# Altium footprint library EXPLORER.PcbLib: 252 footprints (part 15 of 16)
Each footprint in its own frame and in the unit in brackets; x right, y up, seen from the top. Pads: shape width x height; smd on the part's side, far side on the other; paste and mask are expansions set on the pad; w line width, h text height; cw(c..) or ccw(c..) is an arc to the next point about the centre after c.
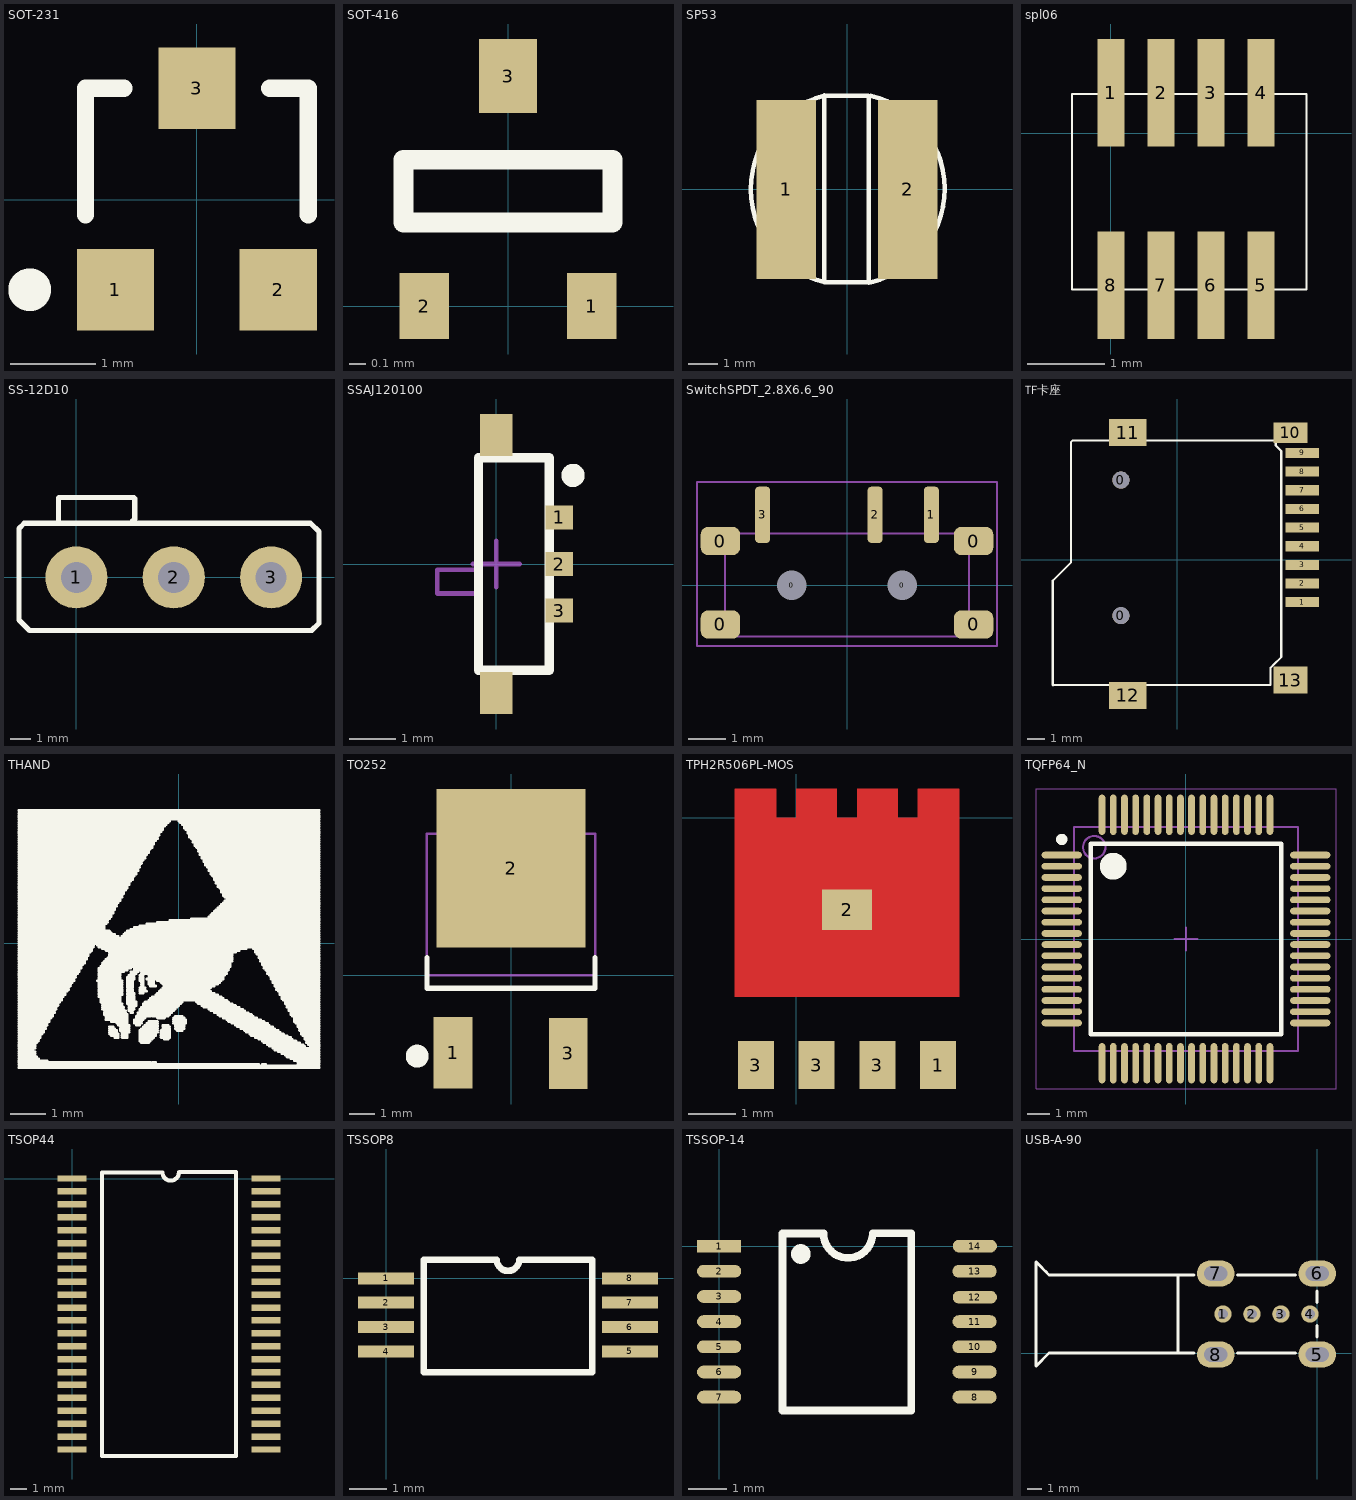
[diagram p14: the footprints below, top view; thin cyan lines are the x and y axes]

## SOT-231 [mm]
pads (3):
  rect 0.9x0.95 smd: 1(-0.95,-1.048) 2(0.95,-1.048) 3(0,1.302)
Top Overlay:
  circle w0.25: c-1.95,-1.048 r0.125
  lines w0.2: -1.3,-0.173 -1.3,1.302 -0.85,1.302 ; 0.85,1.302 1.3,1.302 1.3,-0.173

## SOT-416 [mm]
height 0.7
pads (3):
  rect 0.3x0.4 smd: 1(0.508,0) 2(-0.508,0)
  rect 0.35x0.45 smd: 3(0,1.397)
Top Overlay:
  lines w0.12: -0.635,0.508 -0.635,0.889 0.635,0.889 0.635,0.508 -0.635,0.508

## SP53 [mm]
pads (2):
  rect 2x6 smd: 1(-2.037,0) 2(2.027,0)
Top Overlay:
  lines w0.152: -0.768,-3.111 -0.768,3.149 ; 0.706,3.138 -0.765,3.138 ccw(c-0.018,0.013) -0.744,-3.117 0.712,-3.117 ; 0.732,-3.137 0.732,3.111 ; 0.784,3.143 cw(c0.058,0.013) 0.805,-3.112

## spl06 [mm]
pads (8):
  rect 0.35x1.4 smd: 1(0,0.525) 2(0.65,0.525) 3(1.3,0.525) 4(1.95,0.525) 5(1.95,-1.975) 6(1.3,-1.975) 7(0.65,-1.975) 8(0,-1.975)
Top Overlay:
  lines w0.025: -0.508,-2.032 2.54,-2.032 2.54,0.508 -0.508,0.508 -0.508,-2.032

## SS-12D10 [mm]
height 8.5
pads (3):
  round 3 hole 1.5: 1(0,0) 2(4.7,0) 3(9.4,0)
Top Overlay:
  lines w0.254: -0.864,2.692 -0.864,3.835 -0.838,3.861 2.769,3.861 2.819,3.81 2.819,2.819 2.692,2.692 ; -2.769,-2.057 -2.261,-2.565 11.354,-2.565 11.709,-2.21 11.709,2.21 11.303,2.616 -2.515,2.616 -2.769,2.362 -2.769,-2.057

## SSAJ120100 [mm]
pads (5):
  rect 0.6x0.51 smd: 1(1.355,1) 2(1.355,0) 3(1.355,-1)
  rect 0.7x0.9 smd: ""(0,-2.775) ""(0,2.775)
Top Overlay:
  circle w0.25: c1.651,1.905 r0.125
  lines w0.2: -0.381,-2.286 -0.381,2.286 1.143,2.286 1.143,-2.159 1.143,-2.286 -0.381,-2.286
Mechanical 13:
  lines w0.1: -0.381,-0.635 -1.27,-0.635 -1.27,-0.127 -0.381,-0.127 ; -0.381,-2.286 1.143,-2.286 1.143,2.286 -0.381,2.286 -0.381,-2.286
Mechanical 15:
  lines w0.1: -0.5,0 0.5,0 ; 0,-0.5 0,0.5
3D body: height 0.6, standoff 0.1, extent -0.381,-2.286 1.143,2.286
3D body: height 0.6, standoff 0.1, extent -1.27,-0.635 -0.381,-0.127

## SwitchSPDT_2.8X6.6_90 [mil]
pads (9):
  rrect50% 42x30 smd: 0(-135,-42) 0(-135,47) 0(135,-42) 0(135,47)
  round 10 hole 31.5: 0(-59.06,0) 0(59.06,0)
  rrect50% 16x60 smd: 1(90,75) 2(30,75) 3(-90,75)
Mechanical 13:
  lines w2: -130,-55 -130,55 130,55 130,-55 -130,-55
Mechanical 14:
  lines w2: -160,-65 -160,110 160,110 160,-65 -160,-65
3D body: height 55.12, standoff -19.68, extent -152.23,-110.66 150.92,86.19

## TF卡座 [mm]
pads (15):
  round 1 hole 1 unplated: 0(-3.334,-3.305) 0(-3.334,4.696)
  rect 2x0.6 smd: 1(7.366,-2.505) 2(7.366,-1.405) 3(7.366,-0.305) 4(7.366,0.795) 5(7.366,1.895) 6(7.366,2.995) 7(7.366,4.095) 8(7.366,5.195) 9(7.366,6.295)
  rect 2x1.2 smd: 10(6.666,7.495)
  rect 2.2x1.6 smd: 11(-2.934,7.495) 12(-2.934,-8.005)
  rect 2x1.6 smd: 13(6.666,-7.105)
Top Overlay:
  lines w0.127: -7.354,-7.385 -7.354,-1.242 -6.287,-0.176 -6.287,6.936 -6.185,7.038 5.804,7.038 5.804,6.733 5.905,6.632 6.125,6.412 6.125,-5.747 5.702,-6.17 5.499,-6.373 5.499,-7.389 -7.334,-7.405
3D body: height 3.2, standoff 0.5, extent -9.384,-8.305 7.816,7.795

## THAND [mm]
Top Overlay:
  drawing of 472 lines, arcs and shapes, not listed

## TO252 [mil] "252晶体管"
pads (3):
  rect 60x110 smd: 1(-89.55,-119.77) 3(88.45,-120.77)
  rect 230x245 smd: 2(0,165.35)
Top Overlay:
  circle w19.68: c-145,-125 r7.87
  lines w7.87: -130,27.56 -130,-20 130,-20 130,27.56
Mechanical 15:
  lines w3.94: -105.04,218.5 -105.04,236.06 -65.59,271.65 65.59,271.65 105.04,236.06 105.04,218.5 ; -130,0 130,0 130,218.5 -130,218.5 -130,0
3D body: height 90.55, standoff -0.2, extent -127.95,-120 127.95,250.84

## TPH2R506PL-MOS [mm]
pads (5):
  rect 0.75x1 smd: 1(2.965,-5.175) 3(-0.845,-5.175) 3(0.425,-5.175) 3(1.695,-5.175)
  rect 1.05x0.85 smd: 2(1.06,-1.925)
Top Layer:
  region: -0.42,0 -0.42,0.6 -1.29,0.6 -1.29,-3.75 3.41,-3.75 3.41,0.6 2.54,0.6 2.54,0 2.12,0 2.12,0.6 1.27,0.6 1.27,0 0.85,0 0.85,0.6 0,0.6 0,0

## TQFP64_N [mm] "Thin QFP, 64-Leads, Body 10x10mm, Pitch 0.5mm, IPC Medium Density"
height 1.6
pads (64):
  oval 1.8x0.3 smd: 1(-5.55,3.75) 2(-5.55,3.25) 3(-5.55,2.75) 4(-5.55,2.25) 5(-5.55,1.75) 6(-5.55,1.25) 7(-5.55,0.75) 8(-5.55,0.25) 9(-5.55,-0.25) 10(-5.55,-0.75) 11(-5.55,-1.25) 12(-5.55,-1.75) 13(-5.55,-2.25) 14(-5.55,-2.75) 15(-5.55,-3.25) 16(-5.55,-3.75) 33(5.55,-3.75) 34(5.55,-3.25) 35(5.55,-2.75) 36(5.55,-2.25) 37(5.55,-1.75) 38(5.55,-1.25) 39(5.55,-0.75) 40(5.55,-0.25) 41(5.55,0.25) 42(5.55,0.75) 43(5.55,1.25) 44(5.55,1.75) 45(5.55,2.25) 46(5.55,2.75) 47(5.55,3.25) 48(5.55,3.75)
  oval 0.3x1.8 smd: 17(-3.75,-5.55) 18(-3.25,-5.55) 19(-2.75,-5.55) 20(-2.25,-5.55) 21(-1.75,-5.55) 22(-1.25,-5.55) 23(-0.75,-5.55) 24(-0.25,-5.55) 25(0.25,-5.55) 26(0.75,-5.55) 27(1.25,-5.55) 28(1.75,-5.55) 29(2.25,-5.55) 30(2.75,-5.55) 31(3.25,-5.55) 32(3.75,-5.55) 49(3.75,5.55) 50(3.25,5.55) 51(2.75,5.55) 52(2.25,5.55) 53(1.75,5.55) 54(1.25,5.55) 55(0.75,5.55) 56(0.25,5.55) 57(-0.25,5.55) 58(-0.75,5.55) 59(-1.25,5.55) 60(-1.75,5.55) 61(-2.25,5.55) 62(-2.75,5.55) 63(-3.25,5.55) 64(-3.75,5.55)
Top Overlay:
  circle w0.6: c-3.25,3.25 r0.3
  circle w0.25: c-5.55,4.45 r0.125
  lines w0.2: -4.25,-4.25 4.25,-4.25 4.25,4.25 -4.25,4.25 -4.25,-4.25
Mechanical 13:
  circle w0.1: c-4.1,4.1 r0.5
  lines w0.1: -5,-5 5,-5 5,5 -5,5 -5,-5
Mechanical 15:
  lines w0.05: -6.7,-6.7 6.7,-6.7 6.7,6.7 -6.7,6.7 -6.7,-6.7
  lines w0.1: -0.5,0 0.5,0 ; 0,-0.5 0,0.5
3D body: height 1.6, standoff 0, extent -5,-5 5,5

## TSOP44 [mm]
pads (44):
  rect 1.8x0.4 smd: 1(-0.009,0.001) 2(-0.009,-0.799) 3(-0.009,-1.599) 4(-0.009,-2.399) 5(-0.009,-3.199) 6(-0.009,-3.999) 7(-0.009,-4.799) 8(-0.009,-5.599) 9(-0.009,-6.399) 10(-0.009,-7.199) 11(-0.009,-7.999) 12(-0.009,-8.799) 13(-0.009,-9.599) 14(-0.009,-10.399) 15(-0.009,-11.199) 16(-0.009,-11.999) 17(-0.009,-12.799) 18(-0.009,-13.599) 19(-0.009,-14.399) 20(-0.009,-15.199) 21(-0.009,-15.999) 22(-0.009,-16.799) 23(11.991,-16.799) 24(11.991,-15.999) 25(11.991,-15.199) 26(11.991,-14.399) 27(11.991,-13.599) 28(11.991,-12.799) 29(11.991,-11.999) 30(11.991,-11.199) 31(11.991,-10.399) 32(11.991,-9.599) 33(11.991,-8.799) 34(11.991,-7.999) 35(11.991,-7.199) 36(11.991,-6.399) 37(11.991,-5.599) 38(11.991,-4.799) 39(11.991,-3.999) 40(11.991,-3.199) 41(11.991,-2.399) 42(11.991,-1.599) 43(11.991,-0.799) 44(11.991,0.001)
Top Overlay:
  lines w0.2: 1.826,-17.199 10.156,-17.199
  lines w0.254: 6.604,0.381 cw(c6.096,0.381) 5.588,0.381 1.846,0.381 1.846,-17.18 1.826,-17.199 10.156,-17.199 ; 6.624,0.401 10.156,0.401 10.156,-17.199 ; 10.156,-17.199 10.156,-17.199

## TSSOP8 [mm]
height 1.75
pads (8):
  rect 1.5x0.32 smd: 1(0,0) 2(0,-0.65) 3(0,-1.3) 4(0,-1.95) 5(6.5,-1.95) 6(6.5,-1.3) 7(6.5,-0.65) 8(6.5,0)
Top Overlay:
  lines w0.178: 1,0.5 1,-2.5 5.5,-2.5 5.5,0.5 3.55,0.5 cw(c3.25,0.5) 2.95,0.5 1.05,0.5

## TSSOP-14 [mm] "4.96x4.40x1.00 e=0.65（蒜米工坊）"
pads (14):
  rect 1.143x0.33 smd: 1(0,0)
  oval 1.143x0.33 smd: 2(0,-0.65) 3(0,-1.3) 4(0,-1.95) 5(0,-2.6) 6(0,-3.25) 7(0,-3.9) 8(6.6,-3.9) 9(6.6,-3.25) 10(6.6,-2.6) 11(6.6,-1.95) 12(6.608,-1.321) 13(6.6,-0.65) 14(6.608,0)
Top Overlay:
  circle w0.254: c2.112,-0.203 r0.127
  lines w0.2: 2.687,0.325 1.635,0.325 1.635,-4.249 4.965,-4.249 4.965,0.325 ; 2.696,0.33 ccw(c3.331,0.33) 3.966,0.33 4.96,0.33
3D body: height 1.03, standoff -0.02, extent 0.028,-4.43 6.432,0.57

## USB-A-90 [mm]
pads (8):
  round 1.2 hole 0.7: 1(-6.5,2.7) 2(-4.5,2.7) 3(-2.5,2.7) 4(-0.5,2.7)
  oval 2.6x1.8 hole 1 slot 1.6 at 0 deg: 5(0,-0.1) 6(0,5.5) 7(-7,5.5) 8(-7,-0.1)
Top Overlay:
  lines w0.203: -18.75,5.65 -18.5,5.4 ; -17.2,0 -8.5,0 ; -16.8,0 -18.5,0 -19.4,-0.9 -19.4,6.3 -18.5,5.4 ; -15.6,5.4 -18.5,5.4 ; -9.6,0 -9.6,5.4 ; -8.5,5.4 -18.5,5.4 ; -5.5,0 -1.5,0 ; -5.5,5.4 -1.5,5.4 ; 0,1.1 0,1.9 ; 0,3.5 0,4.3